# Altium footprint library JL_PCB.PCBLIB: 1129 footprints (part 70 of 72)
Each footprint in its own frame and in the unit in brackets; x right, y up, seen from the top. Pads: shape width x height; smd on the part's side, far side on the other; paste and mask are expansions set on the pad; w line width, h text height; cw(c..) or ccw(c..) is an arc to the next point about the centre after c.
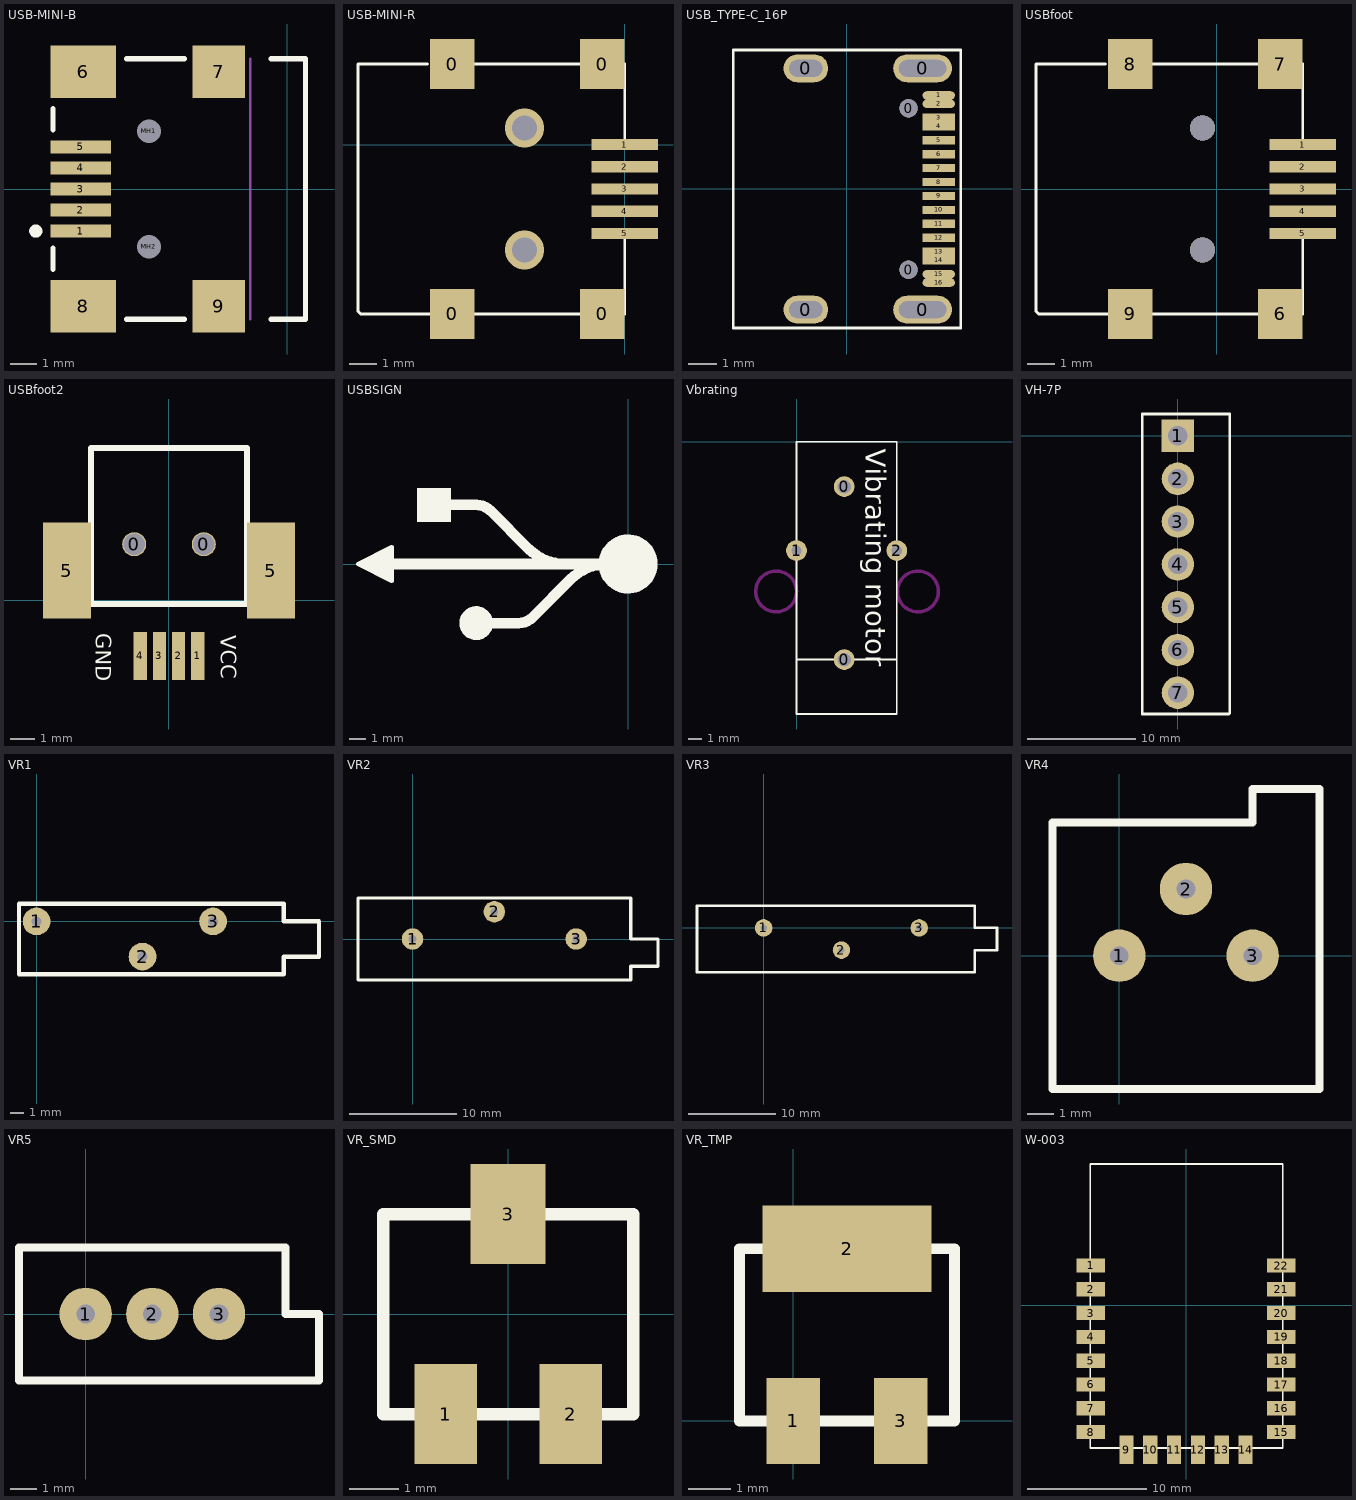
[diagram p69: the footprints below, top view; thin cyan lines are the x and y axes]

## USB-MINI-B [mm] "Connector; USB2.0, Type A, SM; 5 Position; Right Angle"
height 3.9
pads (11):
  rect 2.3x0.5 smd: 1(-7.85,-1.6) 2(-7.85,-0.8) 3(-7.85,0) 4(-7.85,0.8) 5(-7.85,1.6)
  rect 2.5x2 smd: 6(-7.75,4.45) 8(-7.75,-4.45)
  rect 2x2 smd: 7(-2.6,4.45) 9(-2.6,-4.45)
  round 0.6 hole 0.9 unplated: MH1(-5.25,2.2) MH2(-5.25,-2.2)
TopOverlay:
  circle w0.25: c-9.55,-1.6 r0.125
  lines w0.2: -8.9,-3.05 -8.9,-2.25 ; -8.9,2.25 -8.9,3.05 ; -6.1,-4.95 -3.9,-4.95 ; -6.1,4.95 -3.9,4.95 ; -0.6,-4.95 0.7,-4.95 0.7,4.95 -0.6,4.95
Mechanical1:
  lines w0.1: -1.4,-4.95 -1.4,4.95
  text "PCB Edge" at 0.432,-4.036 h0.25
3D body "User Library-USB_mini_B.STEP": height 3.95, standoff -1, extent -8.55,-5.35 0.65,5.35

## USB-MINI-R [mm]
pads (9):
  rect 1.6x1.8 smd: 0(-6.2,-6.1) 0(-6.2,2.9) 0(-0.8,-6.1) 0(-0.8,2.9)
  rect 2.4x0.4 smd: 1(0,0) 2(0,-0.8) 3(0,-1.6) 4(0,-2.4) 5(0,-3.2)
via -3.6,0.6 diameter 1.4 hole 0.9
via -3.6,-3.8 diameter 1.4 hole 0.9
TopOverlay:
  lines w0.1: -7.1,2.9 -9.6,2.9 -9.6,-6 -9.5,-6.1 -7,-6.1 ; -5.4,-6.1 -1.6,-6.1 ; -5.4,2.9 -1.6,2.9 ; 0,-6.1 0,-3.4 ; 0,0.2 0,2.9

## USB_TYPE-C_16P [mm]
pads (22):
  oval 1.6x1 hole 0.6 slot 1.2 at 0 deg: 0(-1.458,-4.324) 0(-1.458,4.316)
  round 0.65 hole 0.65: 0(2.222,-2.894) 0(2.222,2.886)
  oval 2.1x1 hole 0.6 slot 1.7 at 0 deg: 0(2.722,-4.324) 0(2.722,4.316)
  oval 1.16x0.3 smd: 1(3.302,3.346) 2(3.302,3.046) 15(3.302,-3.054) 16(3.302,-3.354)
  rect 1.16x0.3 smd: 3(3.302,2.546) 4(3.302,2.246) 5(3.302,1.746) 6(3.302,1.246) 7(3.302,0.746) 8(3.302,0.246) 9(3.302,-0.254) 10(3.302,-0.754) 11(3.302,-1.254) 12(3.302,-1.754) 13(3.302,-2.254) 14(3.302,-2.554)
TopOverlay:
  lines w0.1: -4.058,-4.984 4.092,-4.984 4.092,4.976 -4.058,4.976 -4.058,-4.984

## USBfoot [mm]
pads (9):
  rect 2.4x0.4 smd: 1(3.1,1.6) 2(3.1,0.8) 3(3.1,0) 4(3.1,-0.8) 5(3.1,-1.6)
  rect 1.6x1.8 smd: 6(2.3,-4.5) 7(2.3,4.5) 8(-3.1,4.5) 9(-3.1,-4.5)
via -0.5,2.2 diameter 0.9 hole 0.9
via -0.5,-2.2 diameter 0.9 hole 0.9
TopOverlay:
  lines w0.1: -4,4.5 -6.5,4.5 -6.5,-4.4 -6.4,-4.5 -3.9,-4.5 ; -2.3,-4.5 1.5,-4.5 ; -2.3,4.5 1.5,4.5 ; 3.1,-4.5 3.1,-1.8 ; 3.1,1.8 3.1,4.5

## USBfoot2 [mm]
pads (8):
  round 1 hole 0.9: 0(-1.45,2.325) 0(1.45,2.325)
  rect 0.55x2 smd: 1(1.2,-2.325) 2(0.4,-2.325) 3(-0.4,-2.325) 4(-1.2,-2.325)
  rect 2x4 smd: 5(-4.25,1.225) 5(4.25,1.225)
TopOverlay:
  lines w0.254: -3.25,-0.175 3.25,-0.175 3.25,6.325 -3.25,6.325 -3.25,-0.175
  text "GND" at -3.05,-1.375 h0.64
  text "VCC" at 2.15,-1.475 h0.64

## USBSIGN [mil]
TopOverlay:
  circle w60: c0,0 r40
  circle w40: c-360,-140 r20
  region: -420,180 -500,180 -500,100 -420,100
  lines w10: -600,1 -578,19 -580,0 -609,6 -577,-18 -569,24 -619,1 -569,-25 -569,31 -628,1 -560,-33 ; -640,0 -560,-40 -560,40 -640,0
  lines w25: -580,0 -340,0 0,0 -50,0 ccw(c-50,-120.71) -135.36,-35.36 -225.86,-125.86 cw(c-260,-91.72) -260,-140 -340,-140 ; -440,140 -360,140 cw(c-360,91.72) -325.86,125.86 -235.35,35.35 ccw(c-150,120.71) -150,0 -120,0 ; -320,-140 -310,-140 ; -170,0 -100,0

## Vbrating [mil]
pads (4):
  round 60 hole 39.37: 0(137.8,-630) 0(137.8,-129.92)
  round 60 hole 30: 1(0,-314.96) 2(290,-314.96)
TopOverlay:
  lines w5: 0,-629.92 290,-629.92 ; 287.4,0 0,0 0,-787.4 290,-787.4 290,0
  text "Vibrating motor" at 180,-20 h100
KeepOutLayer:
  circle w10: c-59.06,-433.07 r59.06
  circle w10: c350.94,-433.07 r59.06

## VH-7P [mm]
pads (7):
  rect 3x3 hole 1.8: 1(0,0)
  round 3 hole 1.8: 2(0,-3.96) 3(0,-7.92) 4(0,-11.88) 5(0,-15.84) 6(0,-19.8) 7(0,-23.76)
TopOverlay:
  rectangle: -3.296,2.032 -1.096,2.032
  lines w0.254: -3.296,-25.728 4.704,-25.728 4.804,-25.628 4.804,2.032 -3.296,2.032 -3.296,-25.728

## VR1 [mm]
pads (3):
  round 2 hole 0.711: 1(0,0) 2(7.62,-2.54) 3(12.7,0)
TopOverlay:
  lines w0.305: -1.27,-3.81 -1.27,1.27 17.78,1.27 17.78,0 20.32,0 20.32,-2.54 17.78,-2.54 17.78,-3.81 -1.27,-3.81

## VR2 [mm]
pads (3):
  round 2 hole 0.711: 1(0,0) 2(7.62,2.54) 3(15.24,0)
TopOverlay:
  lines w0.305: -5.08,-3.81 20.32,-3.81 20.32,-2.54 22.86,-2.54 22.86,0 20.32,0 20.32,3.81 -5.08,3.81 -5.08,-3.81

## VR3 [mm]
pads (3):
  round 2 hole 0.711: 1(0,0) 2(8.89,-2.54) 3(17.78,0)
TopOverlay:
  lines w0.305: -7.62,-5.08 -7.62,2.54 24.13,2.54 24.13,0 26.67,0 26.67,-2.54 24.13,-2.54 24.13,-5.08 -7.62,-5.08

## VR4 [mm]
pads (3):
  round 2 hole 0.711: 1(0,0) 2(2.54,2.54) 3(5.08,0)
TopOverlay:
  lines w0.305: -2.54,-5.08 -2.54,5.08 5.08,5.08 5.08,6.35 7.62,6.35 7.62,-5.08 -2.54,-5.08

## VR5 [mm]
pads (3):
  round 2 hole 0.711: 1(0,0) 2(2.54,0) 3(5.08,0)
TopOverlay:
  lines w0.305: -2.54,-2.54 -2.54,2.54 7.62,2.54 7.62,0 8.89,0 8.89,-2.54 -2.54,-2.54

## VR_SMD [mil]
pads (3):
  rect 50x80 smd: 1(-50,-80) 2(50,-80)
  rect 60x80 smd: 3(0,80)
TopOverlay:
  lines w10: -100,-80 100,-80 100,80 -100,80 -100,-80

## VR_TMP [mil]
pads (3):
  rect 50x80 smd: 1(0,0) 3(100,0)
  rect 157.48x80 smd: 2(50,160)
TopOverlay:
  lines w10: -50,0 150,0 150,160 -50,160 -50,0

## W-003 [mm]
pads (22):
  rect 2.4x1.2 smd: 1(-8.022,3.358) 2(-8.022,1.358) 3(-8.022,-0.642) 4(-8.022,-2.642) 5(-8.022,-4.642) 6(-8.022,-6.642) 7(-8.022,-8.642) 8(-8.022,-10.642) 15(7.978,-10.643) 16(7.978,-8.643) 17(7.978,-6.643) 18(7.978,-4.643) 19(7.978,-2.643) 20(7.978,-0.643) 21(7.978,1.357) 22(7.978,3.357)
  rect 1.2x2.4 smd: 9(-5.022,-12.123) 10(-3.022,-12.123) 11(-1.022,-12.123) 12(0.978,-12.123) 13(2.978,-12.123) 14(4.978,-12.123)
TopOverlay:
  lines w0.152: -8.073,-11.988 -8.073,11.887 8.107,11.887 8.107,-11.988 -8.073,-11.988